# Altium footprint library 总库.PcbLib: 264 footprints (part 13 of 17)
Each footprint in its own frame and in the unit in brackets; x right, y up, seen from the top. Pads: shape width x height; smd on the part's side, far side on the other; paste and mask are expansions set on the pad; w line width, h text height; cw(c..) or ccw(c..) is an arc to the next point about the centre after c.
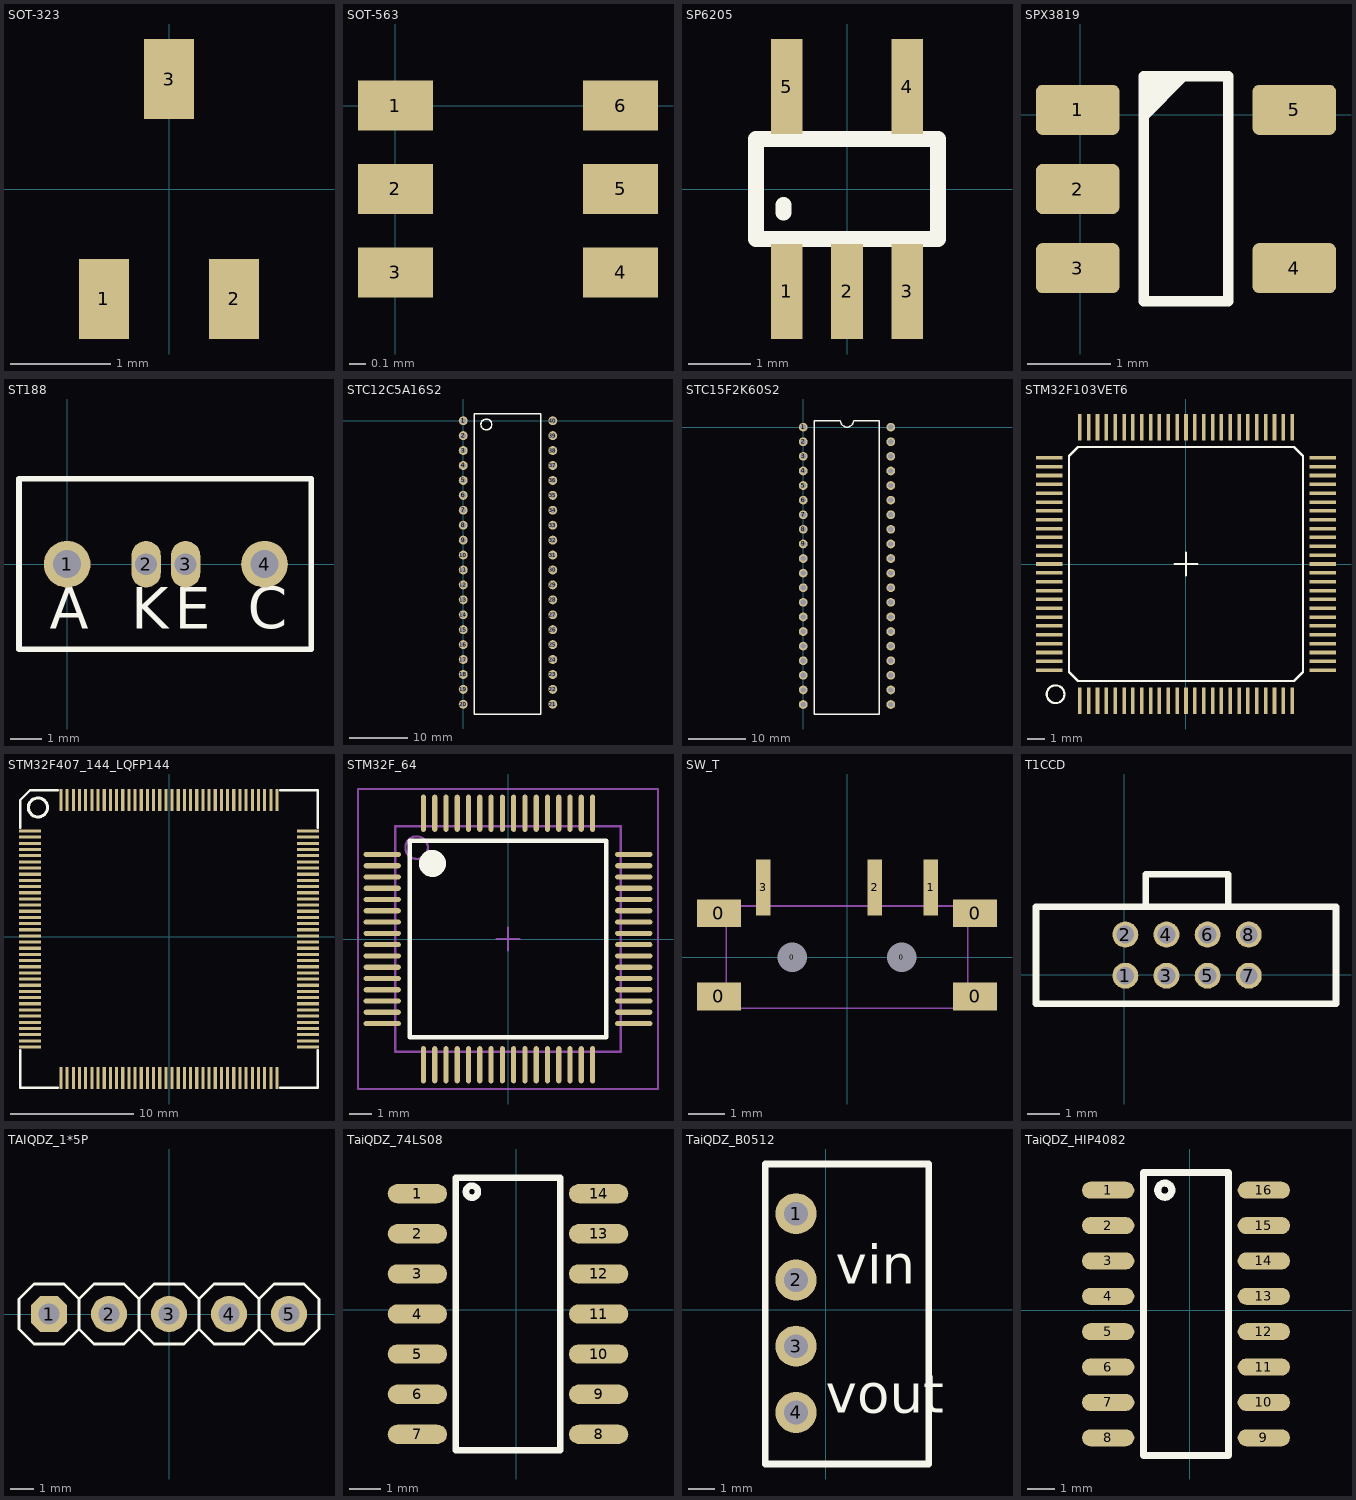
[diagram p12: the footprints below, top view; thin cyan lines are the x and y axes]

## SOT-323 [mm]
pads (3):
  rect 0.5x0.8 smd: 1(-0.65,-1.1) 2(0.65,-1.1) 3(0,1.1)

## SOT-563 [mm]
pads (6):
  rect 0.45x0.3 smd: 1(0,0) 2(0,-0.5) 3(0,-1) 4(1.35,-1) 5(1.35,-0.5) 6(1.35,0)
3D body: height 0.8, standoff 0, extent 0,-1.15 1.35,0.15

## SP6205 [mil] "3.3vLDO"
pads (5):
  rect 20x60 smd: 1(-38,-64.6) 2(0,-64.6) 3(38,-64.6) 4(38,64.6) 5(-38,64.6)
Top Overlay:
  lines w10: -40,-15 -40,-10 ; -57.5,-31.5 57.5,-31.5 57.5,31.5 -57.5,31.5 -57.5,-31.5

## SPX3819 [mm]
pads (5):
  rrect25% 1x0.6 smd: 1(-0.03,0.061) 2(-0.03,-0.889) 3(-0.03,-1.839) 4(2.57,-1.839) 5(2.57,0.061)
Top Overlay:
  region: 0.762,0.464 1.323,0.464 0.762,-0.097
  lines w0.127: 0.762,-2.236 0.762,0.464 1.778,0.464 1.778,-2.236 0.762,-2.236
3D body: height 1.44, standoff -0.01, extent -0.13,-2.339 2.67,0.561

## ST188 [mm]
pads (4):
  round 1.5 hole 0.9: 1(0,0) 4(6.35,0)
  oval 0.95x1.5 hole 0.7: 2(2.54,0) 3(3.81,0)
Top Overlay:
  lines w0.178: -1.549,-2.743 -1.549,2.757 7.851,2.757 7.851,-2.743 -1.549,-2.743
  text "A" at -0.559,-2.515 h2.29
  text "K" at 2.057,-2.515 h2.29
  text "E" at 3.454,-2.515 h2.29
  text "C" at 5.817,-2.489 h2.29

## STC12C5A16S2 [mil]
pads (40):
  round 60 hole 35.43: 1(0,0) 2(0,-100) 3(0,-200) 4(0,-300) 5(0,-400) 6(0,-500) 7(0,-600) 8(0,-700) 9(0,-800) 10(0,-900) 11(0,-1000) 12(0,-1100) 13(0,-1200) 14(0,-1300) 15(0,-1400) 16(0,-1500) 17(0,-1600) 18(0,-1700) 19(0,-1800) 20(0,-1900) 21(600,-1900) 22(600,-1800) 23(600,-1700) 24(600,-1600) 25(600,-1500) 26(600,-1400) 27(600,-1300) 28(600,-1200) 29(600,-1100) 30(600,-1000) 31(600,-900) 32(600,-800) 33(600,-700) 34(600,-600) 35(600,-500) 36(600,-400) 37(600,-300) 38(600,-200) 39(600,-100) 40(600,0)
Top Overlay:
  circle w10: c155,-25 r36.4
  lines w10: 75,-1965 75,45 520,45 520,-1965 75,-1965

## STC15F2K60S2 [mil]
pads (40):
  round 60 hole 35.43: 1(0,0) 2(0,-100) 3(0,-200) 4(0,-300) 5(0,-400) 6(0,-500) 7(0,-600) 8(0,-700) 9(0,-800) 10(0,-900) 11(0,-1000) 12(0,-1100) 13(0,-1200) 14(0,-1300) 15(0,-1400) 16(0,-1500) 17(0,-1600) 18(0,-1700) 19(0,-1800) 20(0,-1900) 21(600,-1900) 22(600,-1800) 23(600,-1700) 24(600,-1600) 25(600,-1500) 26(600,-1400) 27(600,-1300) 28(600,-1200) 29(600,-1100) 30(600,-1000) 31(600,-900) 32(600,-800) 33(600,-700) 34(600,-600) 35(600,-500) 36(600,-400) 37(600,-300) 38(600,-200) 39(600,-100) 40(600,0)
Top Overlay:
  lines w10: 75,-1965 75,45 255,45 ccw(c300,45) 300,0 ccw(c300,45) 345,45 520,45 520,-1965 75,-1965

## STM32F103VET6 [mm]
pads (100):
  rect 0.2x1.5 smd: 1(-6,-7.725) 2(-5.5,-7.725) 3(-5,-7.725) 4(-4.5,-7.725) 5(-4,-7.725) 6(-3.5,-7.725) 7(-3,-7.725) 8(-2.5,-7.725) 9(-2,-7.725) 10(-1.5,-7.725) 11(-1,-7.725) 12(-0.5,-7.725) 13(0,-7.725) 14(0.5,-7.725) 15(1,-7.725) 16(1.5,-7.725) 17(2,-7.725) 18(2.5,-7.725) 19(3,-7.725) 20(3.5,-7.725) 21(4,-7.725) 22(4.5,-7.725) 23(5,-7.725) 24(5.5,-7.725) 25(6,-7.725) 51(6,7.725) 52(5.5,7.725) 53(5,7.725) 54(4.5,7.725) 55(4,7.725) 56(3.5,7.725) 57(3,7.725) 58(2.5,7.725) 59(2,7.725) 60(1.5,7.725) 61(1,7.725) 62(0.5,7.725) 63(0,7.725) 64(-0.5,7.725) 65(-1,7.725) 66(-1.5,7.725) 67(-2,7.725) 68(-2.5,7.725) 69(-3,7.725) 70(-3.5,7.725) 71(-4,7.725) 72(-4.5,7.725) 73(-5,7.725) 74(-5.5,7.725) 75(-6,7.725)
  rect 1.5x0.2 smd: 26(7.725,-6) 27(7.725,-5.5) 28(7.725,-5) 29(7.725,-4.5) 30(7.725,-4) 31(7.725,-3.5) 32(7.725,-3) 33(7.725,-2.5) 34(7.725,-2) 35(7.725,-1.5) 36(7.725,-1) 37(7.725,-0.5) 38(7.725,0) 39(7.725,0.5) 40(7.725,1) 41(7.725,1.5) 42(7.725,2) 43(7.725,2.5) 44(7.725,3) 45(7.725,3.5) 46(7.725,4) 47(7.725,4.5) 48(7.725,5) 49(7.725,5.5) 50(7.725,6) 76(-7.725,6) 77(-7.725,5.5) 78(-7.725,5) 79(-7.725,4.5) 80(-7.725,4) 81(-7.725,3.5) 82(-7.725,3) 83(-7.725,2.5) 84(-7.725,2) 85(-7.725,1.5) 86(-7.725,1) 87(-7.725,0.5) 88(-7.725,0) 89(-7.725,-0.5) 90(-7.725,-1) 91(-7.725,-1.5) 92(-7.725,-2) 93(-7.725,-2.5) 94(-7.725,-3) 95(-7.725,-3.5) 96(-7.725,-4) 97(-7.725,-4.5) 98(-7.725,-5) 99(-7.725,-5.5) 100(-7.725,-6)
Top Overlay:
  circle w0.127: c-7.366,-7.358 r0.5
  lines w0.127: -0.635,0 0.635,0 ; 0,-0.635 0,0.635 ; -6.604,-6.096 -6.604,6.096 -6.096,6.604 6.096,6.604 6.604,6.096 6.604,-6.096 6.096,-6.604 -6.096,-6.604 -6.604,-6.096
3D body: height 1.57, standoff -0.05, extent -8,-7.999 8,8.001

## STM32F407_144_LQFP144 [mm]
pads (144):
  rect 1.8x0.254 smd: 1(-11.287,8.56) 2(-11.287,8.06) 3(-11.287,7.56) 4(-11.287,7.06) 5(-11.287,6.56) 6(-11.287,6.06) 7(-11.287,5.56) 8(-11.287,5.06) 9(-11.287,4.56) 10(-11.287,4.06) 11(-11.287,3.56) 12(-11.287,3.06) 13(-11.287,2.56) 14(-11.287,2.06) 15(-11.287,1.56) 16(-11.287,1.06) 17(-11.287,0.56) 18(-11.287,0.06) 19(-11.287,-0.44) 20(-11.287,-0.94) 21(-11.287,-1.44) 22(-11.287,-1.94) 23(-11.287,-2.44) 24(-11.287,-2.94) 25(-11.287,-3.44) 26(-11.287,-3.94) 27(-11.287,-4.44) 28(-11.287,-4.94) 29(-11.287,-5.44) 30(-11.287,-5.94) 31(-11.287,-6.44) 32(-11.287,-6.94) 33(-11.287,-7.44) 34(-11.287,-7.94) 35(-11.287,-8.44) 36(-11.287,-8.94) 73(11.213,-8.94) 74(11.213,-8.44) 75(11.213,-7.94) 76(11.213,-7.44) 77(11.213,-6.94) 78(11.213,-6.44) 79(11.213,-5.94) 80(11.213,-5.44) 81(11.213,-4.94) 82(11.213,-4.44) 83(11.213,-3.94) 84(11.213,-3.44) 85(11.213,-2.94) 86(11.213,-2.44) 87(11.213,-1.94) 88(11.213,-1.44) 89(11.213,-0.94) 90(11.213,-0.44) 91(11.213,0.06) 92(11.213,0.56) 93(11.213,1.06) 94(11.213,1.56) 95(11.213,2.06) 96(11.213,2.56) 97(11.213,3.06) 98(11.213,3.56) 99(11.213,4.06) 100(11.213,4.56) 101(11.213,5.06) 102(11.213,5.56) 103(11.213,6.06) 104(11.213,6.56) 105(11.213,7.06) 106(11.213,7.56) 107(11.213,8.06) 108(11.213,8.56)
  rect 0.254x1.8 smd: 37(-8.787,-11.44) 38(-8.287,-11.44) 39(-7.787,-11.44) 40(-7.287,-11.44) 41(-6.787,-11.44) 42(-6.287,-11.44) 43(-5.787,-11.44) 44(-5.287,-11.44) 45(-4.787,-11.44) 46(-4.287,-11.44) 47(-3.787,-11.44) 48(-3.287,-11.44) 49(-2.787,-11.44) 50(-2.287,-11.44) 51(-1.787,-11.44) 52(-1.287,-11.44) 53(-0.787,-11.44) 54(-0.287,-11.44) 55(0.213,-11.44) 56(0.713,-11.44) 57(1.213,-11.44) 58(1.713,-11.44) 59(2.213,-11.44) 60(2.713,-11.44) 61(3.213,-11.44) 62(3.713,-11.44) 63(4.213,-11.44) 64(4.713,-11.44) 65(5.213,-11.44) 66(5.713,-11.44) 67(6.213,-11.44) 68(6.713,-11.44) 69(7.213,-11.44) 70(7.713,-11.44) 71(8.213,-11.44) 72(8.713,-11.44) 109(8.713,11.06) 110(8.213,11.06) 111(7.713,11.06) 112(7.213,11.06) 113(6.713,11.06) 114(6.213,11.06) 115(5.713,11.06) 116(5.213,11.06) 117(4.713,11.06) 118(4.213,11.06) 119(3.713,11.06) 120(3.213,11.06) 121(2.713,11.06) 122(2.213,11.06) 123(1.713,11.06) 124(1.213,11.06) 125(0.713,11.06) 126(0.213,11.06) 127(-0.287,11.06) 128(-0.787,11.06) 129(-1.287,11.06) 130(-1.787,11.06) 131(-2.287,11.06) 132(-2.787,11.06) 133(-3.287,11.06) 134(-3.787,11.06) 135(-4.287,11.06) 136(-4.787,11.06) 137(-5.287,11.06) 138(-5.787,11.06) 139(-6.287,11.06) 140(-6.787,11.06) 141(-7.287,11.06) 142(-7.787,11.06) 143(-8.287,11.06) 144(-8.787,11.06)
Top Overlay:
  circle w0.254: c-10.653,10.465 r0.773
  lines w0.2: -12.087,-9.19 -12.087,-12.24 -9.037,-12.24 ; -12.087,8.81 -12.087,11.06 -11.287,11.86 -9.037,11.86 ; 8.963,-12.24 12.013,-12.24 12.013,-9.19 ; 8.963,11.86 12.013,11.86 12.013,8.81
3D body: height 1.5, standoff -0.07, extent -10.947,-11.064 10.825,10.708

## STM32F_64 [mm] "TSQFP, 64-Leads, Body 12.0x12.0mm (max), Pitch 0.50mm, IPC Medium Density"
height 1.6
pads (64):
  oval 1.65x0.23 smd: 1(-5.575,3.75) 2(-5.575,3.25) 3(-5.575,2.75) 4(-5.575,2.25) 5(-5.575,1.75) 6(-5.575,1.25) 7(-5.575,0.75) 8(-5.575,0.25) 9(-5.575,-0.25) 10(-5.575,-0.75) 11(-5.575,-1.25) 12(-5.575,-1.75) 13(-5.575,-2.25) 14(-5.575,-2.75) 15(-5.575,-3.25) 16(-5.575,-3.75) 33(5.575,-3.75) 34(5.575,-3.25) 35(5.575,-2.75) 36(5.575,-2.25) 37(5.575,-1.75) 38(5.575,-1.25) 39(5.575,-0.75) 40(5.575,-0.25) 41(5.575,0.25) 42(5.575,0.75) 43(5.575,1.25) 44(5.575,1.75) 45(5.575,2.25) 46(5.575,2.75) 47(5.575,3.25) 48(5.575,3.75)
  oval 0.23x1.65 smd: 17(-3.75,-5.575) 18(-3.25,-5.575) 19(-2.75,-5.575) 20(-2.25,-5.575) 21(-1.75,-5.575) 22(-1.25,-5.575) 23(-0.75,-5.575) 24(-0.25,-5.575) 25(0.25,-5.575) 26(0.75,-5.575) 27(1.25,-5.575) 28(1.75,-5.575) 29(2.25,-5.575) 30(2.75,-5.575) 31(3.25,-5.575) 32(3.75,-5.575) 49(3.75,5.575) 50(3.25,5.575) 51(2.75,5.575) 52(2.25,5.575) 53(1.75,5.575) 54(1.25,5.575) 55(0.75,5.575) 56(0.25,5.575) 57(-0.25,5.575) 58(-0.75,5.575) 59(-1.25,5.575) 60(-1.75,5.575) 61(-2.25,5.575) 62(-2.75,5.575) 63(-3.25,5.575) 64(-3.75,5.575)
Top Overlay:
  circle w0.6: c-3.35,3.35 r0.3
  lines w0.2: -4.35,-4.35 -4.35,4.35 4.35,4.35 4.35,-4.35 -4.35,-4.35
Mechanical 13:
  circle w0.1: c-4.05,4.05 r0.5
  lines w0.1: -5,-5 -5,5 5,5 5,-5 -5,-5
Mechanical 15:
  lines w0.1: -0.5,0 0.5,0 ; 0,-0.5 0,0.5 ; -6.65,-6.65 -6.65,6.65 6.65,6.65 6.65,-6.65 -6.65,-6.65
3D body: height 1.59, standoff -0.01, extent -6.1,-6.1 6.1,6.1

## SW_T [mm]
pads (9):
  rect 1.2x0.762 smd: 0(-3.5,-1.073) 0(-3.5,1.2) 0(3.5,-1.073) 0(3.5,1.2)
  round 0.254 hole 0.8: 0(-1.5,0) 0(1.5,0)
  rect 0.4x1.524 smd: 1(2.286,1.905) 2(0.762,1.905) 3(-2.286,1.905)
Mechanical 13:
  lines w0.051: -3.302,-1.397 -3.302,1.397 3.302,1.397 3.302,-1.397 -3.302,-1.397

## T1CCD [mm]
pads (8):
  round 0.8 hole 0.55: 1(0.027,-0.027) 2(0.027,1.243) 3(1.297,-0.027) 4(1.297,1.243) 5(2.567,-0.027) 6(2.567,1.243) 7(3.837,-0.027) 8(3.837,1.243)
Top Overlay:
  lines w0.203: 0.662,2.106 0.662,3.106 3.193,3.106 ; 3.202,2.106 3.202,3.097 ; -2.73,-0.894 6.53,-0.894 6.53,2.106 -2.73,2.106 -2.73,-0.894

## TAIQDZ_1*5P [mil]
pads (5):
  oct 60x60 hole 35: 1(-200,0)
  round 60 hole 35: 2(-100,0) 3(0,0) 4(100,0) 5(200,0)
Top Overlay:
  lines w5: -150,-25 -150,25 ; -150,-25 -175,-50 -225,-50 -250,-25 -250,25 -225,50 -175,50 -150,25 ; -150,-25 -125,-50 -75,-50 -50,-25 ; -150,25 -125,50 -75,50 -50,25 ; -50,-25 -25,-50 25,-50 50,-25 ; -50,-25 -50,25 ; -50,25 -25,50 25,50 50,25 ; 50,-25 50,25 ; 50,-25 75,-50 125,-50 150,-25 ; 50,25 75,50 125,50 150,25 ; 150,-25 150,25 ; 150,-25 175,-50 225,-50 250,-25 250,25 225,50 175,50 150,25
3D body: height 397.64, standoff -59.06, extent -250,-50 250,50

## TaiQDZ_74LS08 [mil]
pads (14):
  oval 74x24 smd: 1(-123,145) 2(-123,95) 3(-123,45) 4(-123,-5) 5(-123,-55) 6(-123,-105) 7(-123,-155) 8(103,-155) 9(103,-105) 10(103,-55) 11(103,-5) 12(103,45) 13(103,95) 14(103,145)
Top Overlay:
  circle w8: c-55,147.5 r7.5
  lines w8: -75,-175 55,-175 55,165 -75,165 -75,-175
3D body: height 61.02, standoff -1.97, extent -127.83,-176.06 108,166.06

## TaiQDZ_B0512 [mil]
pads (4):
  round 62 hole 36: 1(-45,145) 2(-45,45) 3(-45,-55) 4(-45,-155)
Top Overlay:
  lines w10: -91.22,-232.76 -91.22,220 155,220 155,-232.76 -91.22,-232.76
  text "vout" at 0,-175 h100
  text "vin" at 15,20 h100

## TaiQDZ_HIP4082 [mil]
pads (16):
  oval 74x24 smd: 1(-115,170) 2(-115,120) 3(-115,70) 4(-115,20) 5(-115,-30) 6(-115,-80) 7(-115,-130) 8(-115,-180) 9(105,-180) 10(105,-130) 11(105,-80) 12(105,-30) 13(105,20) 14(105,70) 15(105,120) 16(105,170)
Top Overlay:
  circle w10: c-35,170 r10
  lines w10: -65,-205 -65,195 55,195 55,-205 -65,-205
3D body: height 68.9, standoff 0, extent -120,-197 108.35,188.83